# Altium footprint library kalios.PcbLib: 404 footprints (part 13 of 26)
Each footprint in its own frame and in the unit in brackets; x right, y up, seen from the top. Pads: shape width x height; smd on the part's side, far side on the other; paste and mask are expansions set on the pad; w line width, h text height; cw(c..) or ccw(c..) is an arc to the next point about the centre after c.
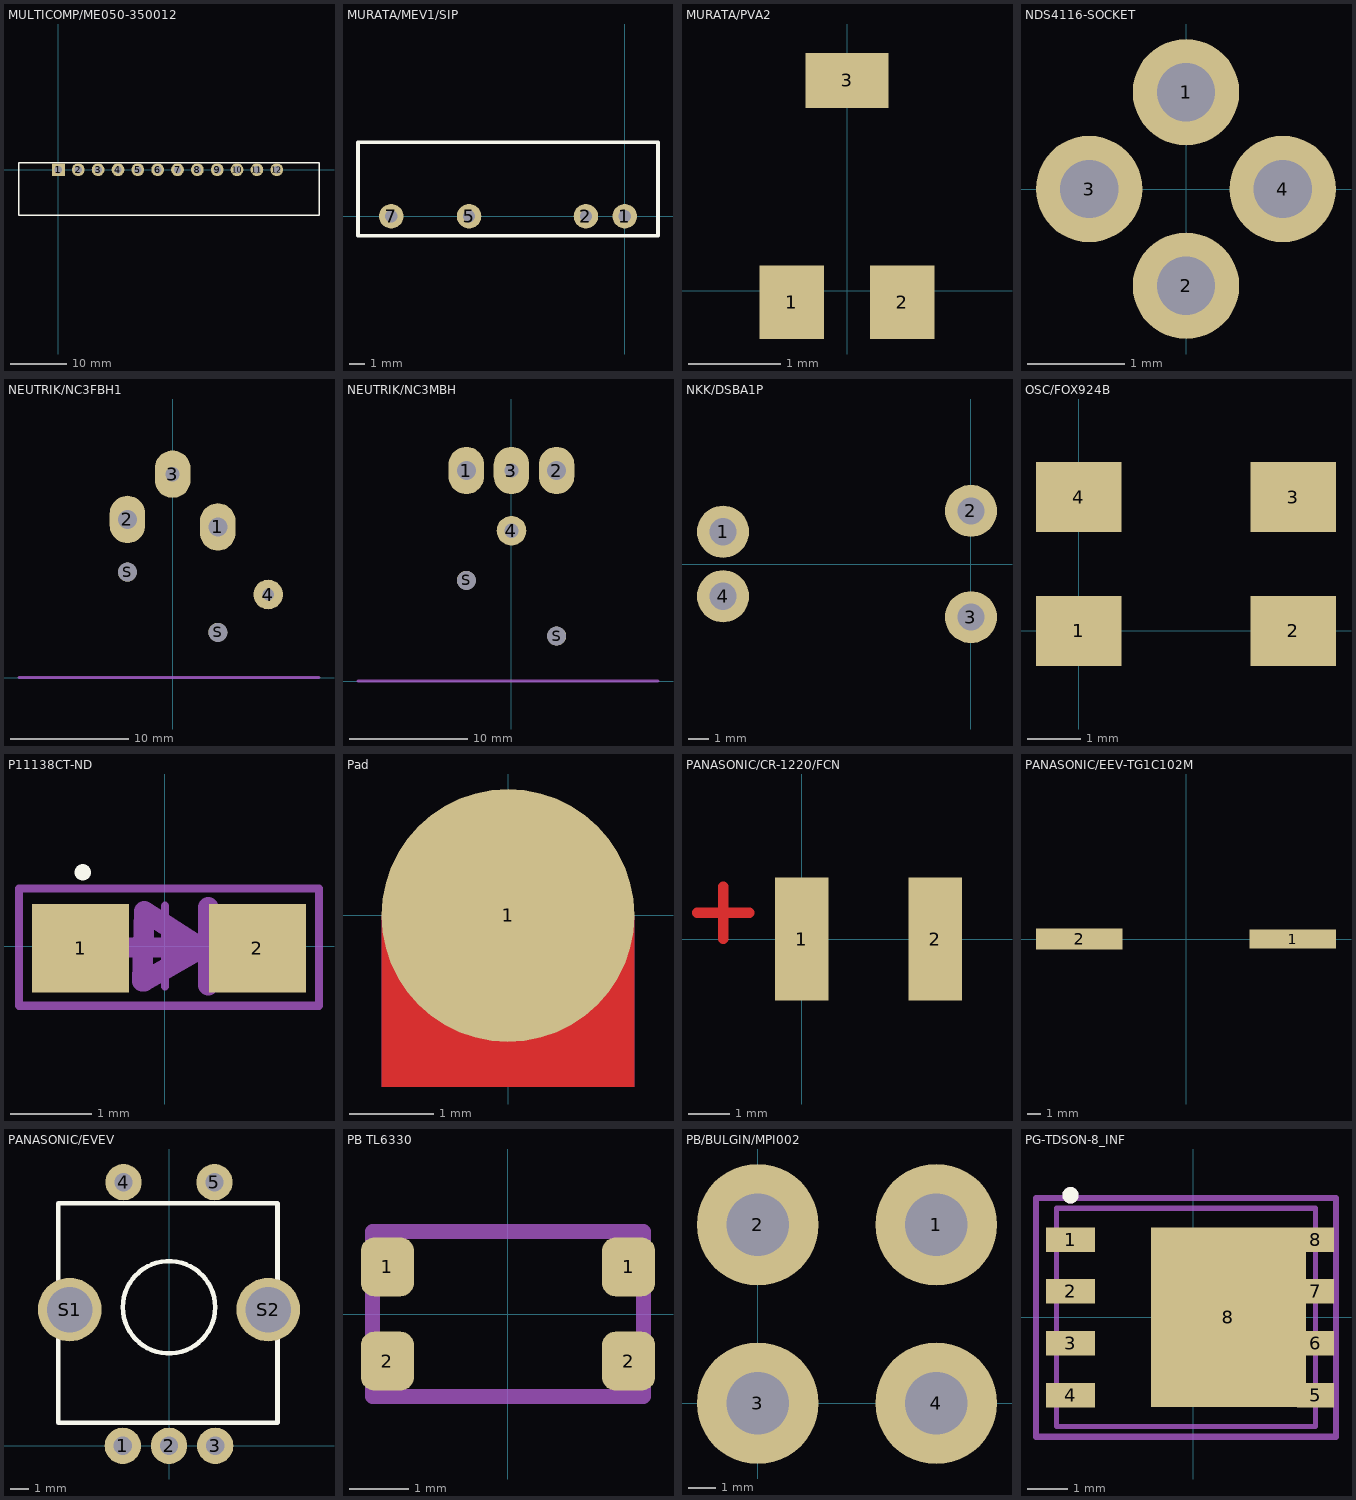
[diagram p12: the footprints below, top view; thin cyan lines are the x and y axes]

## MULTICOMP/ME050-350012 [mm] "Side entry header 3.5mm 10 pol"
height 6.9
pads (12):
  rect 2.25x2.25 hole 1.3: 1(0,0)
  round 2.25 hole 1.3: 2(3.5,0) 3(7,0) 4(10.5,0) 5(14,0) 6(17.5,0) 7(21,0) 8(24.5,0) 9(28,0) 10(31.5,0) 11(35,0) 12(38.5,0)
Top Overlay:
  lines w0.254: -6.95,-8 0,-8 39,-8 45.95,-8 45.95,1.2 39,1.2 0,1.2 -6.95,1.2 -6.95,-8
Top Designator:
  text ".Designator" at 11.882,-4.025 h1.52
3D body "ME050-350012.STEP": height 6.95, standoff -3.45, extent -6.696,-8.362 45.304,0.838

## MURATA/MEV1/SIP [mm]
pads (4):
  round 1.6 hole 0.8: 1(0,0) 2(-2.54,0) 5(-10.16,0) 7(-15.24,0)
Top Overlay:
  lines w0.254: -17.399,-1.27 2.159,-1.27 2.159,4.826 -17.399,4.826 -17.399,-1.27
Top Designator:
  text ".Designator" at -15.238,1.27 h1.52
3D body "MEV1S0505SC.STEP": height 10.15, standoff -3.6, extent -17.47,-1.295 2.18,4.855

## MURATA/PVA2 [mm]
pads (3):
  rect 0.7x0.8 smd: 1(-0.6,-0.127) 2(0.6,-0.127)
  rect 0.9x0.6 smd: 3(0,2.286)
Top Designator:
  text ".Designator" at -7.618,0.522 h1.52
3D body "PVZ2A.STEP": height 0.8, standoff 0, extent -1.05,-0.33 1.05,2.37

## NDS4116-SOCKET [mm]
pads (4):
  round 1.1 hole 0.6: 1(0,1) 2(0,-1) 3(-1,0) 4(1,0)
Top Designator:
  text ".Designator" at -7.615,-0.508 h1.52
3D body "NDS4116-socket.STEP": height 8.52, standoff -2.53, extent -2.769,-2.775 2.773,2.775

## NEUTRIK/NC3FBH1 [mm]
pads (6):
  oval 3x4 hole 1.6: 1(3.81,12.7) 2(-3.81,13.335)
  oval 3x4 hole 1.2: 3(0,17.15)
  round 2.5 hole 1: 4(8.06,7)
  round 1.6 hole 1.6 unplated: S(-3.81,8.89) S(3.81,3.81)
Top Courtyard:
  lines w0.254: -12.954,0 12.344,0
Top Designator:
  text ".Designator" at -7.91,5.85 h1.52
3D body "D-NC3FBH1.STEP": height 29.07, standoff -3.5, extent -12.852,-6.842 12.496,19.558

## NEUTRIK/NC3MBH [mm]
pads (6):
  oval 3x4 hole 1.6: 1(-3.81,17.78) 2(3.81,17.78)
  oval 3x4 hole 1.2: 3(0,17.78)
  round 2.5 hole 1.2: 4(0,12.7)
  round 1.6 hole 1.6 unplated: S(-3.81,8.509) S(3.81,3.81)
Top Courtyard:
  lines w0.254: -12.954,0 12.37,0
Top Designator:
  text ".Designator" at -7.91,8.059 h1.52
3D body "D-NC3MBAH.STEP": height 25.35, standoff -3.5, extent -12.926,-2.748 12.418,19.152

## NKK/DSBA1P [mm]
pads (4):
  round 2.5 hole 1.3: 1(-11.9,1.55) 2(0,2.55) 3(0,-2.55) 4(-11.9,-1.55)
Top Designator:
  text ".Designator" at -13.568,-0.559 h1.52
3D body "Dsba1p.STEP": height 9.19, standoff -3.11, extent -12.388,-4.801 0.704,4.699

## OSC/FOX924B [mm]
pads (4):
  rect 1.6x1.3 smd: 1(0,0) 2(4,0) 3(4,2.5) 4(0,2.5)
Top Designator:
  text ".Designator" at -5.618,0.742 h1.52

## P11138CT-ND [mm] "Chip Resistor, Body 2.0x1.3mm, IPC Low Density"
height 0.65
pads (2):
  rect 1.2x1.1 smd: 1(-1.041,-0.025) 2(1.143,-0.025)
Top Overlay:
  lines w0.2: -1.016,0.91 -1.016,0.914
Top 3D Body:
  lines w0.254: -0.991,-0.025 1.016,0 ; -0.279,-0.432 -0.254,0.432 0.457,-0.025 -0.254,-0.432 ; -0.279,-0.406 -0.279,-0.381 -0.203,-0.356 ; 0.533,-0.483 0.533,0.483
Top Courtyard:
  lines w0.1: -0.5,0 0.5,0 ; 0,-0.5 0,0.5 ; -1.803,-0.737 1.905,-0.737 1.905,0.711 -1.803,0.711 -1.803,-0.737
Top Designator:
  text ".Designator" at -7.567,-0.394 h1.52
3D body "P11138CT-ND.STEP": height 0.9, standoff 0, extent -1.049,-0.66 1.151,0.54

## Pad [mm]
pads (1):
  round 3 all layers, no hole: 1(0,0)
Top Layer:
  rectangle: -1.499,-2.032 1.499,0
Bottom Layer:
  rectangle: -1.499,-2.032 1.499,0
Top Solder:
  rectangle: -1.6,-2.057 1.6,-0.025
Bottom Solder:
  rectangle: -1.6,-2.057 1.6,-0.025
Top Designator:
  text ".Designator" at -7.618,-0.736 h1.52

## PANASONIC/CR-1220/FCN [mm]
pads (2):
  rect 1.3x3 smd: 1(0,0) 2(3.25,0)
Top Layer:
  lines w0.254: -2.54,0.635 -1.27,0.635 ; -1.905,0 -1.905,1.27
Top Designator:
  text ".Designator" at -6.043,6.808 h1.52
3D body "P279-ND.STEP": height 2.66, standoff -0.14, extent -4.664,-0.96 7.812,16.234

## PANASONIC/EEV-TG1C102M [mm]
pads (2):
  rect 6.5x1.4 smd: 1(8,0)
  rect 6.5x1.6 smd: 2(-8,0)
Top Designator:
  text ".Designator" at -7.618,-0.491 h1.52
3D body "EEV-TG1C102M.STEP": height 16.61, standoff -0.1, extent -9.398,-8.484 9.602,8.516

## PANASONIC/EVEV [mm]
height 15
pads (7):
  round 2 hole 1: 1(-2.54,0) 2(0,0) 3(2.54,0) 4(-2.5,14.5) 5(2.5,14.5)
  round 3.5 hole 2.5 unplated: S1(-5.461,7.493) S2(5.461,7.493)
Top Overlay:
  circle w0.254: c0,7.62 r2.54
  lines w0.254: -6.096,1.27 5.969,1.27 5.969,13.335 -6.096,13.335 -6.096,1.27
Top Designator:
  text ".Designator" at -7.618,6.742 h1.52
3D body "EVE-VCGJL016B.STEP": height 20, standoff -3.5, extent -5.969,-0.411 6.031,14.889

## PB TL6330 [mm]
pads (4):
  rrect50% 0.9x1 smd: 1(-2.05,0.8) 1(2.05,0.8) 2(-2.05,-0.8) 2(2.05,-0.8)
Top Courtyard:
  lines w0.254: -2.3,-1.4 2.3,-1.4 2.3,1.4 -2.3,1.4 -2.3,-1.4
Top Designator:
  text ".Designator" at -3.999,1.667 h0.7
3D body "TL6330AF200Q--3DModel-STEP-520916.STEP": height 1.89, standoff -0.01, extent -2.3,-1.4 2.3,1.4

## PB/BULGIN/MPI002 [mm]
pads (4):
  round 4.5 hole 2.3: 1(6.6,6.6) 2(0,6.6) 3(0,0) 4(6.6,0)
Top Designator:
  text ".Designator" at -4.265,2.693 h1.52
3D body "bouton_on.STEP": height 27.34, standoff -2.3, extent -9.002,-9.628 15.708,16.029

## PG-TDSON-8_INF [mm]
pads (9):
  rect 1.2x0.6 smd: 1(-3,1.905) 2(-3,0.635) 3(-3,-0.635) 4(-3,-1.905)
  rect 0.9x0.6 smd: 5(3,-1.905) 6(3,-0.635) 7(3,0.635) 8(3,1.905)
  rect 3.8x4.4 smd paste-3: 8(0.864,0)
Top Overlay:
  circle w0.2: c-3.005,2.992 r0.1
Top Paste:
  region: 0.6,-1.8 -0.582,-1.8 -0.582,-0.605 0.6,-0.605
  region: 2.2,-1.8 1.018,-1.8 1.018,-0.605 2.2,-0.605
  region: 2.2,0.6 1.018,0.6 1.018,1.795 2.2,1.795
  region: 0.6,0.6 -0.582,0.6 -0.582,1.795 0.6,1.795
Top 3D Body:
  circle w0.2: c-3.005,2.992 r0.1
  lines w0.127: -3.35,-2.675 3,-2.675 3,2.675 -3.35,2.675 -3.35,-2.675
Top Courtyard:
  lines w0.15: -3.85,-2.925 3.5,-2.925 3.5,2.925 -3.85,2.925 -3.85,-2.925
3D body "User Library-son_1p27-6x5x1p10-5_8n.STEP": height 1.1, standoff 0, extent -3.124,-2.575 3.026,2.575